# Altium integrated library Lattice CPLD ispLSI.IntLib: 471 symbols (part 4 of 26) (continued)
## ispLSI2032-180LT48 (continued)

## ispLSI2032A-80LJ44
designator U?
In-System Programmable High-Density PLD; Note: Pins 14, 24 and 33 have dual function capability.; Published: 23-Sep-2002; LatestRevisionDate: 13-Apr-2006; LatestRevisionNote: IPC-7351 Footprint Added.; DatasheetVersion: Apr-2000; PackageVersion: pkg_32, Aug-2005; PackageReference: PLCC44; Publisher: Altium Limited; PackageDescription: 44-Pin Leaded Chip Carrier 1.27 mm Pitch; Code_IPC: PLCC-44; ComponentLink1Description: Manufacturer Link; ComponentLink1URL: http://www.latticesemi.com/products/mature/index.cfm; ComponentLink2Description: Datasheet; ComponentLink2URL: http://www.latticesemi.com/lit/docs/datasheets/cpld/2032.pdf
footprint PLCC44_N (Leaded Chip Carrier, 44-Leads, Body 16.6x16.6mm, Pitch 1.27mm, IPC Medium Density)
footprint PLCC44_L (Leaded Chip Carrier, 44-Leads, Body 16.6x16.6mm, Pitch 1.27mm, IPC High Density)
footprint PLCC44_M (Leaded Chip Carrier, 44-Leads, Body 16.6x16.6mm, Pitch 1.27mm, IPC Low Density)
3D model 2032A-PLCC44 (44-Pin Leaded Chip Carrier 1.27 mm Pitch)
pins: 1 GND (power), 2 GOE0 (in), 3 I/O24 (io), 4 I/O25 (io), 5 I/O26 (io), 6 I/O27 (io), 7 I/O28 (io), 8 I/O29 (io), 9 I/O30 (io), 10 I/O31 (io), 11 Y0 (in), 12 VCC (power), 13 ~{ispEN} (in), 14 SDI/IN0 (in), 15 I/O0 (io), 16 I/O1 (io), 17 I/O2 (io), 18 I/O3 (io), 19 I/O4 (io), 20 I/O5 (io), 21 I/O6 (io), 22 I/O7 (io), 23 GND (power), 24 SDO/IN1 (io), 25 I/O8 (io), 26 I/O9 (io), 27 I/O10 (io), 28 I/O11 (io), 29 I/O12 (io), 30 I/O13 (io), 31 I/O14 (io), 32 I/O15 (io), 33 Y2/SCLK (in), 34 VCC (power), 35 Y1/~{RESET} (in), 36 MODE (in), 37 I/O16 (io), 38 I/O17 (io), 39 I/O18 (io), 40 I/O19 (io), 41 I/O20 (io), 42 I/O21 (io), 43 I/O22 (io), 44 I/O23 (io)

## ispLSI2032A-80LJ44I
designator U?
In-System Programmable High-Density PLD; Note: Pins 14, 24 and 33 have dual function capability.; Published: 23-Sep-2002; LatestRevisionDate: 13-Apr-2006; LatestRevisionNote: IPC-7351 Footprint Added.; DatasheetVersion: Apr-2000; PackageVersion: pkg_32, Aug-2005; PackageReference: PLCC44; Publisher: Altium Limited; PackageDescription: 44-Pin Leaded Chip Carrier 1.27 mm Pitch; Code_IPC: PLCC-44; ComponentLink1Description: Manufacturer Link; ComponentLink1URL: http://www.latticesemi.com/products/mature/index.cfm; ComponentLink2Description: Datasheet; ComponentLink2URL: http://www.latticesemi.com/lit/docs/datasheets/cpld/2032.pdf
footprint PLCC44_N (Leaded Chip Carrier, 44-Leads, Body 16.6x16.6mm, Pitch 1.27mm, IPC Medium Density)
footprint PLCC44_L (Leaded Chip Carrier, 44-Leads, Body 16.6x16.6mm, Pitch 1.27mm, IPC High Density)
footprint PLCC44_M (Leaded Chip Carrier, 44-Leads, Body 16.6x16.6mm, Pitch 1.27mm, IPC Low Density)
3D model 2032A-PLCC44 (44-Pin Leaded Chip Carrier 1.27 mm Pitch)
pins: 1 GND (power), 2 GOE0 (in), 3 I/O24 (io), 4 I/O25 (io), 5 I/O26 (io), 6 I/O27 (io), 7 I/O28 (io), 8 I/O29 (io), 9 I/O30 (io), 10 I/O31 (io), 11 Y0 (in), 12 VCC (power), 13 ~{ispEN} (in), 14 SDI/IN0 (in), 15 I/O0 (io), 16 I/O1 (io), 17 I/O2 (io), 18 I/O3 (io), 19 I/O4 (io), 20 I/O5 (io), 21 I/O6 (io), 22 I/O7 (io), 23 GND (power), 24 SDO/IN1 (io), 25 I/O8 (io), 26 I/O9 (io), 27 I/O10 (io), 28 I/O11 (io), 29 I/O12 (io), 30 I/O13 (io), 31 I/O14 (io), 32 I/O15 (io), 33 Y2/SCLK (in), 34 VCC (power), 35 Y1/~{RESET} (in), 36 MODE (in), 37 I/O16 (io), 38 I/O17 (io), 39 I/O18 (io), 40 I/O19 (io), 41 I/O20 (io), 42 I/O21 (io), 43 I/O22 (io), 44 I/O23 (io)

## ispLSI2032A-80LT44
designator U?
In-System Programmable High-Density PLD; Note: Pins 8, 18 and 27 have dual function capability.; Published: 23-Sep-2002; LatestRevisionDate: 13-Apr-2006; LatestRevisionNote: IPC-7351 Footprint Added.; DatasheetVersion: Apr-2000; PackageVersion: pkg_32, Aug-2005; PackageReference: TQFP44; Publisher: Altium Limited; PackageDescription: 44-Pin Thin Quad Flat Pack 0.8 mm Pitch; ComponentLink1Description: Manufacturer Link; ComponentLink1URL: http://www.latticesemi.com/products/mature/index.cfm; ComponentLink2Description: Datasheet; ComponentLink2URL: http://www.latticesemi.com/lit/docs/datasheets/cpld/2032.pdf
footprint TQFP44_N (Thin QFP, 44-Leads, Body 10x10mm, Pitch 0.8mm, IPC Medium Density)
footprint TQFP44_L (Thin QFP, 44-Leads, Body 10x10mm, Pitch 0.8mm, IPC High Density)
footprint TQFP44_M (Thin QFP, 44-Leads, Body 10x10mm, Pitch 0.8mm, IPC Low Density)
3D model 2032A-TQFP44 (44-Pin Thin Quad Flat Pack 0.8 mm Pitch)
pins: 1 I/O28 (io), 2 I/O29 (io), 3 I/O30 (io), 4 I/O31 (io), 5 Y0 (in), 6 VCC (power), 7 ~{ispEN} (in), 8 SDI/IN0 (in), 9 I/O0 (io), 10 I/O1 (io), 11 I/O2 (io), 12 I/O3 (io), 13 I/O4 (io), 14 I/O5 (io), 15 I/O6 (io), 16 I/O7 (io), 17 GND (power), 18 SDO/IN1 (io), 19 I/O8 (io), 20 I/O9 (io), 21 I/O10 (io), 22 I/O11 (io), 23 I/O12 (io), 24 I/O13 (io), 25 I/O14 (io), 26 I/O15 (io), 27 Y2/SCLK (in), 28 VCC (power), 29 Y1/~{RESET} (in), 30 MODE (in), 31 I/O16 (io), 32 I/O17 (io), 33 I/O18 (io), 34 I/O19 (io), 35 I/O20 (io), 36 I/O21 (io), 37 I/O22 (io), 38 I/O23 (io), 39 GND (power), 40 GOE0 (in), 41 I/O24 (io), 42 I/O25 (io), 43 I/O26 (io), 44 I/O27 (io)

## ispLSI2032A-80LT44I
designator U?
In-System Programmable High-Density PLD; Note: Pins 8, 18 and 27 have dual function capability.; Published: 23-Sep-2002; LatestRevisionDate: 13-Apr-2006; LatestRevisionNote: IPC-7351 Footprint Added.; DatasheetVersion: Apr-2000; PackageVersion: pkg_32, Aug-2005; PackageReference: TQFP44; Publisher: Altium Limited; PackageDescription: 44-Pin Thin Quad Flat Pack 0.8 mm Pitch; ComponentLink1Description: Manufacturer Link; ComponentLink1URL: http://www.latticesemi.com/products/mature/index.cfm; ComponentLink2Description: Datasheet; ComponentLink2URL: http://www.latticesemi.com/lit/docs/datasheets/cpld/2032.pdf
footprint TQFP44_N (Thin QFP, 44-Leads, Body 10x10mm, Pitch 0.8mm, IPC Medium Density)
footprint TQFP44_L (Thin QFP, 44-Leads, Body 10x10mm, Pitch 0.8mm, IPC High Density)
footprint TQFP44_M (Thin QFP, 44-Leads, Body 10x10mm, Pitch 0.8mm, IPC Low Density)
3D model 2032A-TQFP44 (44-Pin Thin Quad Flat Pack 0.8 mm Pitch)
pins: 1 I/O28 (io), 2 I/O29 (io), 3 I/O30 (io), 4 I/O31 (io), 5 Y0 (in), 6 VCC (power), 7 ~{ispEN} (in), 8 SDI/IN0 (in), 9 I/O0 (io), 10 I/O1 (io), 11 I/O2 (io), 12 I/O3 (io), 13 I/O4 (io), 14 I/O5 (io), 15 I/O6 (io), 16 I/O7 (io), 17 GND (power), 18 SDO/IN1 (io), 19 I/O8 (io), 20 I/O9 (io), 21 I/O10 (io), 22 I/O11 (io), 23 I/O12 (io), 24 I/O13 (io), 25 I/O14 (io), 26 I/O15 (io), 27 Y2/SCLK (in), 28 VCC (power), 29 Y1/~{RESET} (in), 30 MODE (in), 31 I/O16 (io), 32 I/O17 (io), 33 I/O18 (io), 34 I/O19 (io), 35 I/O20 (io), 36 I/O21 (io), 37 I/O22 (io), 38 I/O23 (io), 39 GND (power), 40 GOE0 (in), 41 I/O24 (io), 42 I/O25 (io), 43 I/O26 (io), 44 I/O27 (io)

## ispLSI2032A-80LT48
designator U?
In-System Programmable High-Density PLD; Note: Pins 8, 19 and 29 have dual function capability.; Published: 23-Sep-2002; LatestRevisionDate: 13-Apr-2006; LatestRevisionNote: IPC-7351 Footprint Added.; DatasheetVersion: Apr-2000; PackageVersion: pkg_32, Aug-2005; PackageReference: TQFP48; Publisher: Altium Limited; PackageDescription: 48-Pin Thin Quad Flat Pack 0.5 mm Pitch; ComponentLink1Description: Manufacturer Link; ComponentLink1URL: http://www.latticesemi.com/products/mature/index.cfm; ComponentLink2Description: Datasheet; ComponentLink2URL: http://www.latticesemi.com/lit/docs/datasheets/cpld/2032.pdf
footprint TQFP48_N (Thin QFP, 48-Leads, Body 7x7mm, Pitch 0.5mm, IPC Medium Density)
footprint TQFP48_L (Thin QFP, 48-Leads, Body 7x7mm, Pitch 0.5mm, IPC High Density)
footprint TQFP48_M (Thin QFP, 48-Leads, Body 7x7mm, Pitch 0.5mm, IPC Low Density)
3D model 2032A-TQFP48 (48-Pin Thin Quad Flat Pack 0.5 mm Pitch)
pins: 1 I/O28 (io), 2 I/O29 (io), 3 I/O30 (io), 4 I/O31 (io), 5 Y0 (in), 6 VCC (power), 7 ~{ispEN} (in), 8 SDI/IN0 (in), 9 I/O0 (io), 10 I/O1 (io), 11 I/O2 (io), 12 NC, 13 I/O3 (io), 14 I/O4 (io), 15 I/O5 (io), 16 I/O6 (io), 17 I/O7 (io), 18 GND (power), 19 SDO/IN1 (io), 20 I/O8 (io), 21 I/O9 (io), 22 I/O10 (io), 23 I/O11 (io), 24 NC, 25 I/O12 (io), 26 I/O13 (io), 27 I/O14 (io), 28 I/O15 (io), 29 Y2/SCLK (in), 30 VCC (power), 31 Y1/~{RESET} (in), 32 MODE (in), 33 I/O16 (io), 34 I/O17 (io), 35 I/O18 (io), 36 NC, 37 I/O19 (io), 38 I/O20 (io), 39 I/O21 (io), 40 I/O22 (io), 41 I/O23 (io), 42 GND (power), 43 GOE0 (in), 44 I/O24 (io), 45 I/O25 (io), 46 I/O26 (io), 47 I/O27 (io), 48 NC

## ispLSI2032A-80LT48I
designator U?
In-System Programmable High-Density PLD; Note: Pins 8, 19 and 29 have dual function capability.; Published: 23-Sep-2002; LatestRevisionDate: 13-Apr-2006; LatestRevisionNote: IPC-7351 Footprint Added.; DatasheetVersion: Apr-2000; PackageVersion: pkg_32, Aug-2005; PackageReference: TQFP48; Publisher: Altium Limited; PackageDescription: 48-Pin Thin Quad Flat Pack 0.5 mm Pitch; ComponentLink1Description: Manufacturer Link; ComponentLink1URL: http://www.latticesemi.com/products/mature/index.cfm; ComponentLink2Description: Datasheet; ComponentLink2URL: http://www.latticesemi.com/lit/docs/datasheets/cpld/2032.pdf
footprint TQFP48_N (Thin QFP, 48-Leads, Body 7x7mm, Pitch 0.5mm, IPC Medium Density)
footprint TQFP48_L (Thin QFP, 48-Leads, Body 7x7mm, Pitch 0.5mm, IPC High Density)
footprint TQFP48_M (Thin QFP, 48-Leads, Body 7x7mm, Pitch 0.5mm, IPC Low Density)
3D model 2032A-TQFP48 (48-Pin Thin Quad Flat Pack 0.5 mm Pitch)
pins: 1 I/O28 (io), 2 I/O29 (io), 3 I/O30 (io), 4 I/O31 (io), 5 Y0 (in), 6 VCC (power), 7 ~{ispEN} (in), 8 SDI/IN0 (in), 9 I/O0 (io), 10 I/O1 (io), 11 I/O2 (io), 12 NC, 13 I/O3 (io), 14 I/O4 (io), 15 I/O5 (io), 16 I/O6 (io), 17 I/O7 (io), 18 GND (power), 19 SDO/IN1 (io), 20 I/O8 (io), 21 I/O9 (io), 22 I/O10 (io), 23 I/O11 (io), 24 NC, 25 I/O12 (io), 26 I/O13 (io), 27 I/O14 (io), 28 I/O15 (io), 29 Y2/SCLK (in), 30 VCC (power), 31 Y1/~{RESET} (in), 32 MODE (in), 33 I/O16 (io), 34 I/O17 (io), 35 I/O18 (io), 36 NC, 37 I/O19 (io), 38 I/O20 (io), 39 I/O21 (io), 40 I/O22 (io), 41 I/O23 (io), 42 GND (power), 43 GOE0 (in), 44 I/O24 (io), 45 I/O25 (io), 46 I/O26 (io), 47 I/O27 (io), 48 NC

## ispLSI2032A-110LJ44
designator U?
In-System Programmable High-Density PLD; Note: Pins 14, 24 and 33 have dual function capability.; Published: 23-Sep-2002; LatestRevisionDate: 13-Apr-2006; LatestRevisionNote: IPC-7351 Footprint Added.; DatasheetVersion: Apr-2000; PackageVersion: pkg_32, Aug-2005; PackageReference: PLCC44; Publisher: Altium Limited; PackageDescription: 44-Pin Leaded Chip Carrier 1.27 mm Pitch; Code_IPC: PLCC-44; ComponentLink1Description: Manufacturer Link; ComponentLink1URL: http://www.latticesemi.com/products/mature/index.cfm; ComponentLink2Description: Datasheet; ComponentLink2URL: http://www.latticesemi.com/lit/docs/datasheets/cpld/2032.pdf
footprint PLCC44_N (Leaded Chip Carrier, 44-Leads, Body 16.6x16.6mm, Pitch 1.27mm, IPC Medium Density)
footprint PLCC44_L (Leaded Chip Carrier, 44-Leads, Body 16.6x16.6mm, Pitch 1.27mm, IPC High Density)
footprint PLCC44_M (Leaded Chip Carrier, 44-Leads, Body 16.6x16.6mm, Pitch 1.27mm, IPC Low Density)
3D model 2032A-PLCC44 (44-Pin Leaded Chip Carrier 1.27 mm Pitch)
pins: 1 GND (power), 2 GOE0 (in), 3 I/O24 (io), 4 I/O25 (io), 5 I/O26 (io), 6 I/O27 (io), 7 I/O28 (io), 8 I/O29 (io), 9 I/O30 (io), 10 I/O31 (io), 11 Y0 (in), 12 VCC (power), 13 ~{ispEN} (in), 14 SDI/IN0 (in), 15 I/O0 (io), 16 I/O1 (io), 17 I/O2 (io), 18 I/O3 (io), 19 I/O4 (io), 20 I/O5 (io), 21 I/O6 (io), 22 I/O7 (io), 23 GND (power), 24 SDO/IN1 (io), 25 I/O8 (io), 26 I/O9 (io), 27 I/O10 (io), 28 I/O11 (io), 29 I/O12 (io), 30 I/O13 (io), 31 I/O14 (io), 32 I/O15 (io), 33 Y2/SCLK (in), 34 VCC (power), 35 Y1/~{RESET} (in), 36 MODE (in), 37 I/O16 (io), 38 I/O17 (io), 39 I/O18 (io), 40 I/O19 (io), 41 I/O20 (io), 42 I/O21 (io), 43 I/O22 (io), 44 I/O23 (io)

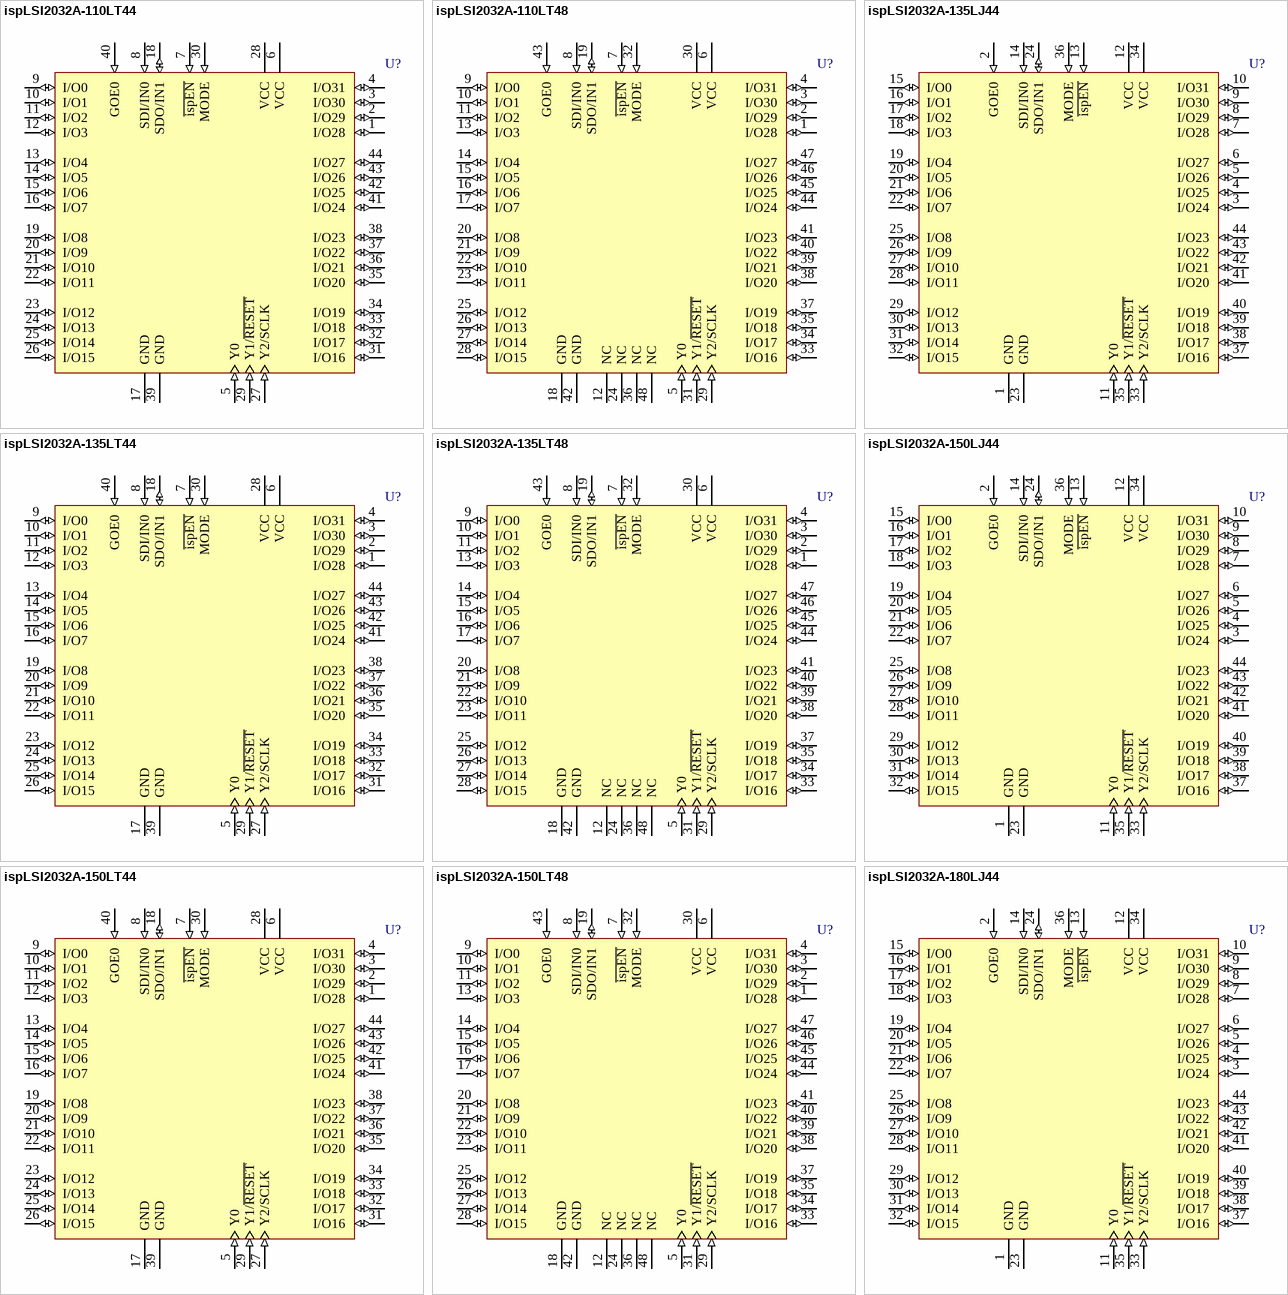
[diagram p34: symbols ispLSI2032A-110LT44 to ispLSI2032A-180LJ44]

## ispLSI2032A-110LT44
designator U?
In-System Programmable High-Density PLD; Note: Pins 8, 18 and 27 have dual function capability.; Published: 23-Sep-2002; LatestRevisionDate: 13-Apr-2006; LatestRevisionNote: IPC-7351 Footprint Added.; DatasheetVersion: Apr-2000; PackageVersion: pkg_32, Aug-2005; PackageReference: TQFP44; Publisher: Altium Limited; PackageDescription: 44-Pin Thin Quad Flat Pack 0.8 mm Pitch; ComponentLink1Description: Manufacturer Link; ComponentLink1URL: http://www.latticesemi.com/products/mature/index.cfm; ComponentLink2Description: Datasheet; ComponentLink2URL: http://www.latticesemi.com/lit/docs/datasheets/cpld/2032.pdf
footprint TQFP44_N (Thin QFP, 44-Leads, Body 10x10mm, Pitch 0.8mm, IPC Medium Density)
footprint TQFP44_L (Thin QFP, 44-Leads, Body 10x10mm, Pitch 0.8mm, IPC High Density)
footprint TQFP44_M (Thin QFP, 44-Leads, Body 10x10mm, Pitch 0.8mm, IPC Low Density)
3D model 2032A-TQFP44 (44-Pin Thin Quad Flat Pack 0.8 mm Pitch)
pins: 1 I/O28 (io), 2 I/O29 (io), 3 I/O30 (io), 4 I/O31 (io), 5 Y0 (in), 6 VCC (power), 7 ~{ispEN} (in), 8 SDI/IN0 (in), 9 I/O0 (io), 10 I/O1 (io), 11 I/O2 (io), 12 I/O3 (io), 13 I/O4 (io), 14 I/O5 (io), 15 I/O6 (io), 16 I/O7 (io), 17 GND (power), 18 SDO/IN1 (io), 19 I/O8 (io), 20 I/O9 (io), 21 I/O10 (io), 22 I/O11 (io), 23 I/O12 (io), 24 I/O13 (io), 25 I/O14 (io), 26 I/O15 (io), 27 Y2/SCLK (in), 28 VCC (power), 29 Y1/~{RESET} (in), 30 MODE (in), 31 I/O16 (io), 32 I/O17 (io), 33 I/O18 (io), 34 I/O19 (io), 35 I/O20 (io), 36 I/O21 (io), 37 I/O22 (io), 38 I/O23 (io), 39 GND (power), 40 GOE0 (in), 41 I/O24 (io), 42 I/O25 (io), 43 I/O26 (io), 44 I/O27 (io)

## ispLSI2032A-110LT48
designator U?
In-System Programmable High-Density PLD; Note: Pins 8, 19 and 29 have dual function capability.; Published: 23-Sep-2002; LatestRevisionDate: 13-Apr-2006; LatestRevisionNote: IPC-7351 Footprint Added.; DatasheetVersion: Apr-2000; PackageVersion: pkg_32, Aug-2005; PackageReference: TQFP48; Publisher: Altium Limited; PackageDescription: 48-Pin Thin Quad Flat Pack 0.5 mm Pitch; ComponentLink1Description: Manufacturer Link; ComponentLink1URL: http://www.latticesemi.com/products/mature/index.cfm; ComponentLink2Description: Datasheet; ComponentLink2URL: http://www.latticesemi.com/lit/docs/datasheets/cpld/2032.pdf
footprint TQFP48_N (Thin QFP, 48-Leads, Body 7x7mm, Pitch 0.5mm, IPC Medium Density)
footprint TQFP48_L (Thin QFP, 48-Leads, Body 7x7mm, Pitch 0.5mm, IPC High Density)
footprint TQFP48_M (Thin QFP, 48-Leads, Body 7x7mm, Pitch 0.5mm, IPC Low Density)
3D model 2032A-TQFP48 (48-Pin Thin Quad Flat Pack 0.5 mm Pitch)
pins: 1 I/O28 (io), 2 I/O29 (io), 3 I/O30 (io), 4 I/O31 (io), 5 Y0 (in), 6 VCC (power), 7 ~{ispEN} (in), 8 SDI/IN0 (in), 9 I/O0 (io), 10 I/O1 (io), 11 I/O2 (io), 12 NC, 13 I/O3 (io), 14 I/O4 (io), 15 I/O5 (io), 16 I/O6 (io), 17 I/O7 (io), 18 GND (power), 19 SDO/IN1 (io), 20 I/O8 (io), 21 I/O9 (io), 22 I/O10 (io), 23 I/O11 (io), 24 NC, 25 I/O12 (io), 26 I/O13 (io), 27 I/O14 (io), 28 I/O15 (io), 29 Y2/SCLK (in), 30 VCC (power), 31 Y1/~{RESET} (in), 32 MODE (in), 33 I/O16 (io), 34 I/O17 (io), 35 I/O18 (io), 36 NC, 37 I/O19 (io), 38 I/O20 (io), 39 I/O21 (io), 40 I/O22 (io), 41 I/O23 (io), 42 GND (power), 43 GOE0 (in), 44 I/O24 (io), 45 I/O25 (io), 46 I/O26 (io), 47 I/O27 (io), 48 NC

## ispLSI2032A-135LJ44
designator U?
In-System Programmable High-Density PLD; Note: Pins 14, 24 and 33 have dual function capability.; Published: 23-Sep-2002; LatestRevisionDate: 13-Apr-2006; LatestRevisionNote: IPC-7351 Footprint Added.; DatasheetVersion: Apr-2000; PackageVersion: pkg_32, Aug-2005; PackageReference: PLCC44; Publisher: Altium Limited; PackageDescription: 44-Pin Leaded Chip Carrier 1.27 mm Pitch; Code_IPC: PLCC-44; ComponentLink1Description: Manufacturer Link; ComponentLink1URL: http://www.latticesemi.com/products/mature/index.cfm; ComponentLink2Description: Datasheet; ComponentLink2URL: http://www.latticesemi.com/lit/docs/datasheets/cpld/2032.pdf
footprint PLCC44_N (Leaded Chip Carrier, 44-Leads, Body 16.6x16.6mm, Pitch 1.27mm, IPC Medium Density)
footprint PLCC44_L (Leaded Chip Carrier, 44-Leads, Body 16.6x16.6mm, Pitch 1.27mm, IPC High Density)
footprint PLCC44_M (Leaded Chip Carrier, 44-Leads, Body 16.6x16.6mm, Pitch 1.27mm, IPC Low Density)
3D model 2032A-PLCC44 (44-Pin Leaded Chip Carrier 1.27 mm Pitch)
pins: 1 GND (power), 2 GOE0 (in), 3 I/O24 (io), 4 I/O25 (io), 5 I/O26 (io), 6 I/O27 (io), 7 I/O28 (io), 8 I/O29 (io), 9 I/O30 (io), 10 I/O31 (io), 11 Y0 (in), 12 VCC (power), 13 ~{ispEN} (in), 14 SDI/IN0 (in), 15 I/O0 (io), 16 I/O1 (io), 17 I/O2 (io), 18 I/O3 (io), 19 I/O4 (io), 20 I/O5 (io), 21 I/O6 (io), 22 I/O7 (io), 23 GND (power), 24 SDO/IN1 (io), 25 I/O8 (io), 26 I/O9 (io), 27 I/O10 (io), 28 I/O11 (io), 29 I/O12 (io), 30 I/O13 (io), 31 I/O14 (io), 32 I/O15 (io), 33 Y2/SCLK (in), 34 VCC (power), 35 Y1/~{RESET} (in), 36 MODE (in), 37 I/O16 (io), 38 I/O17 (io), 39 I/O18 (io), 40 I/O19 (io), 41 I/O20 (io), 42 I/O21 (io), 43 I/O22 (io), 44 I/O23 (io)

## ispLSI2032A-135LT44
designator U?
In-System Programmable High-Density PLD; Note: Pins 8, 18 and 27 have dual function capability.; Published: 23-Sep-2002; LatestRevisionDate: 13-Apr-2006; LatestRevisionNote: IPC-7351 Footprint Added.; DatasheetVersion: Apr-2000; PackageVersion: pkg_32, Aug-2005; PackageReference: TQFP44; Publisher: Altium Limited; PackageDescription: 44-Pin Thin Quad Flat Pack 0.8 mm Pitch; ComponentLink1Description: Manufacturer Link; ComponentLink1URL: http://www.latticesemi.com/products/mature/index.cfm; ComponentLink2Description: Datasheet; ComponentLink2URL: http://www.latticesemi.com/lit/docs/datasheets/cpld/2032.pdf
footprint TQFP44_N (Thin QFP, 44-Leads, Body 10x10mm, Pitch 0.8mm, IPC Medium Density)
footprint TQFP44_L (Thin QFP, 44-Leads, Body 10x10mm, Pitch 0.8mm, IPC High Density)
footprint TQFP44_M (Thin QFP, 44-Leads, Body 10x10mm, Pitch 0.8mm, IPC Low Density)
3D model 2032A-TQFP44 (44-Pin Thin Quad Flat Pack 0.8 mm Pitch)
pins: 1 I/O28 (io), 2 I/O29 (io), 3 I/O30 (io), 4 I/O31 (io), 5 Y0 (in), 6 VCC (power), 7 ~{ispEN} (in), 8 SDI/IN0 (in), 9 I/O0 (io), 10 I/O1 (io), 11 I/O2 (io), 12 I/O3 (io), 13 I/O4 (io), 14 I/O5 (io), 15 I/O6 (io), 16 I/O7 (io), 17 GND (power), 18 SDO/IN1 (io), 19 I/O8 (io), 20 I/O9 (io), 21 I/O10 (io), 22 I/O11 (io), 23 I/O12 (io), 24 I/O13 (io), 25 I/O14 (io), 26 I/O15 (io), 27 Y2/SCLK (in), 28 VCC (power), 29 Y1/~{RESET} (in), 30 MODE (in), 31 I/O16 (io), 32 I/O17 (io), 33 I/O18 (io), 34 I/O19 (io), 35 I/O20 (io), 36 I/O21 (io), 37 I/O22 (io), 38 I/O23 (io), 39 GND (power), 40 GOE0 (in), 41 I/O24 (io), 42 I/O25 (io), 43 I/O26 (io), 44 I/O27 (io)

## ispLSI2032A-135LT48
designator U?
In-System Programmable High-Density PLD; Note: Pins 8, 19 and 29 have dual function capability.; Published: 23-Sep-2002; LatestRevisionDate: 13-Apr-2006; LatestRevisionNote: IPC-7351 Footprint Added.; DatasheetVersion: Apr-2000; PackageVersion: pkg_32, Aug-2005; PackageReference: TQFP48; Publisher: Altium Limited; PackageDescription: 48-Pin Thin Quad Flat Pack 0.5 mm Pitch; ComponentLink1Description: Manufacturer Link; ComponentLink1URL: http://www.latticesemi.com/products/mature/index.cfm; ComponentLink2Description: Datasheet; ComponentLink2URL: http://www.latticesemi.com/lit/docs/datasheets/cpld/2032.pdf
footprint TQFP48_N (Thin QFP, 48-Leads, Body 7x7mm, Pitch 0.5mm, IPC Medium Density)
footprint TQFP48_L (Thin QFP, 48-Leads, Body 7x7mm, Pitch 0.5mm, IPC High Density)
footprint TQFP48_M (Thin QFP, 48-Leads, Body 7x7mm, Pitch 0.5mm, IPC Low Density)
3D model 2032A-TQFP48 (48-Pin Thin Quad Flat Pack 0.5 mm Pitch)
pins: 1 I/O28 (io), 2 I/O29 (io), 3 I/O30 (io), 4 I/O31 (io), 5 Y0 (in), 6 VCC (power), 7 ~{ispEN} (in), 8 SDI/IN0 (in), 9 I/O0 (io), 10 I/O1 (io), 11 I/O2 (io), 12 NC, 13 I/O3 (io), 14 I/O4 (io), 15 I/O5 (io), 16 I/O6 (io), 17 I/O7 (io), 18 GND (power), 19 SDO/IN1 (io), 20 I/O8 (io), 21 I/O9 (io), 22 I/O10 (io), 23 I/O11 (io), 24 NC, 25 I/O12 (io), 26 I/O13 (io), 27 I/O14 (io), 28 I/O15 (io), 29 Y2/SCLK (in), 30 VCC (power), 31 Y1/~{RESET} (in), 32 MODE (in), 33 I/O16 (io), 34 I/O17 (io), 35 I/O18 (io), 36 NC, 37 I/O19 (io), 38 I/O20 (io), 39 I/O21 (io), 40 I/O22 (io), 41 I/O23 (io), 42 GND (power), 43 GOE0 (in), 44 I/O24 (io), 45 I/O25 (io), 46 I/O26 (io), 47 I/O27 (io), 48 NC

## ispLSI2032A-150LJ44
designator U?
In-System Programmable High-Density PLD; Note: Pins 14, 24 and 33 have dual function capability.; Published: 23-Sep-2002; LatestRevisionDate: 13-Apr-2006; LatestRevisionNote: IPC-7351 Footprint Added.; DatasheetVersion: Apr-2000; PackageVersion: pkg_32, Aug-2005; PackageReference: PLCC44; Publisher: Altium Limited; PackageDescription: 44-Pin Leaded Chip Carrier 1.27 mm Pitch; Code_IPC: PLCC-44; ComponentLink1Description: Manufacturer Link; ComponentLink1URL: http://www.latticesemi.com/products/mature/index.cfm; ComponentLink2Description: Datasheet; ComponentLink2URL: http://www.latticesemi.com/lit/docs/datasheets/cpld/2032.pdf
footprint PLCC44_N (Leaded Chip Carrier, 44-Leads, Body 16.6x16.6mm, Pitch 1.27mm, IPC Medium Density)
footprint PLCC44_L (Leaded Chip Carrier, 44-Leads, Body 16.6x16.6mm, Pitch 1.27mm, IPC High Density)
footprint PLCC44_M (Leaded Chip Carrier, 44-Leads, Body 16.6x16.6mm, Pitch 1.27mm, IPC Low Density)
3D model 2032A-PLCC44 (44-Pin Leaded Chip Carrier 1.27 mm Pitch)
pins: 1 GND (power), 2 GOE0 (in), 3 I/O24 (io), 4 I/O25 (io), 5 I/O26 (io), 6 I/O27 (io), 7 I/O28 (io), 8 I/O29 (io), 9 I/O30 (io), 10 I/O31 (io), 11 Y0 (in), 12 VCC (power), 13 ~{ispEN} (in), 14 SDI/IN0 (in), 15 I/O0 (io), 16 I/O1 (io), 17 I/O2 (io), 18 I/O3 (io), 19 I/O4 (io), 20 I/O5 (io), 21 I/O6 (io), 22 I/O7 (io), 23 GND (power), 24 SDO/IN1 (io), 25 I/O8 (io), 26 I/O9 (io), 27 I/O10 (io), 28 I/O11 (io), 29 I/O12 (io), 30 I/O13 (io), 31 I/O14 (io), 32 I/O15 (io), 33 Y2/SCLK (in), 34 VCC (power), 35 Y1/~{RESET} (in), 36 MODE (in), 37 I/O16 (io), 38 I/O17 (io), 39 I/O18 (io), 40 I/O19 (io), 41 I/O20 (io), 42 I/O21 (io), 43 I/O22 (io), 44 I/O23 (io)